# Altium integrated library PASSIVE_COMPONENTS.IntLib: 6 symbols
Pins are listed as number, name and electrical type; pins without a type are passive.

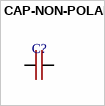
[diagram p0: symbol CAP-NON-POLAR]

## CAP-NON-POLAR
designator C?
footprint CAP-0402
footprint CAP-0201
footprint CAP-0603
footprint CAP-0805
footprint CAP-1206
pins: 1, 2


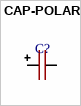
[diagram p1: symbol CAP-POLAR]

## CAP-POLAR
designator C?
footprint CAPPOL-18x40
footprint CAPPOL-30x35
footprint CAPPOL8x12
footprint CAPPOL-12x25
footprint CAPPOL-10x20
footprint Model Name (Footprint not found)
footprint CAP-TAN-A
footprint CAP-TAN-B
footprint CAP-TAN-B2
footprint CAP-TAN-C
footprint CAP-TAN-D
footprint CAP-TAN-R
footprint CAP-TAN-X
pins: 1 +, 2 -


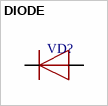
[diagram p2: symbol DIODE]

## DIODE
designator VD?
footprint DIODE-0805
footprint DO-214BA
pins: 1 C, 2 A


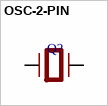
[diagram p3: symbol OSC-2-PIN]

## OSC-2-PIN
designator Q?
footprint OSC-QSMD12.3x4.5x4.2
footprint OSC-QSMD3.2x1.5x0.75
footprint CAP-0402
pins: 1, 2


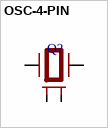
[diagram p4: symbol OSC-4-PIN]

## OSC-4-PIN
designator Q?
footprint OSC-QSMD3.2x2.5x1.0
footprint OSC-QSMD2.0x1.6x0.55
footprint OSC-QSMD3.2x2.5x0.8
footprint Model Name (Footprint not found)
pins: 1, 2, 3, 4


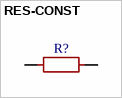
[diagram p5: symbol RES-CONST]

## RES-CONST
designator R?
footprint RES-0603
footprint RES-0201
footprint RES-1206
footprint RES-0402
footprint RES-0805
footprint RES-2512
footprint RES-3921
footprint RES-2W
pins: 1, 2